# Altium footprint library 功率电感.PcbLib: 43 footprints (part 3 of 3)
Each footprint in its own frame and in the unit in brackets; x right, y up, seen from the top. Pads: shape width x height; smd on the part's side, far side on the other; paste and mask are expansions set on the pad; w line width, h text height; cw(c..) or ccw(c..) is an arc to the next point about the centre after c.
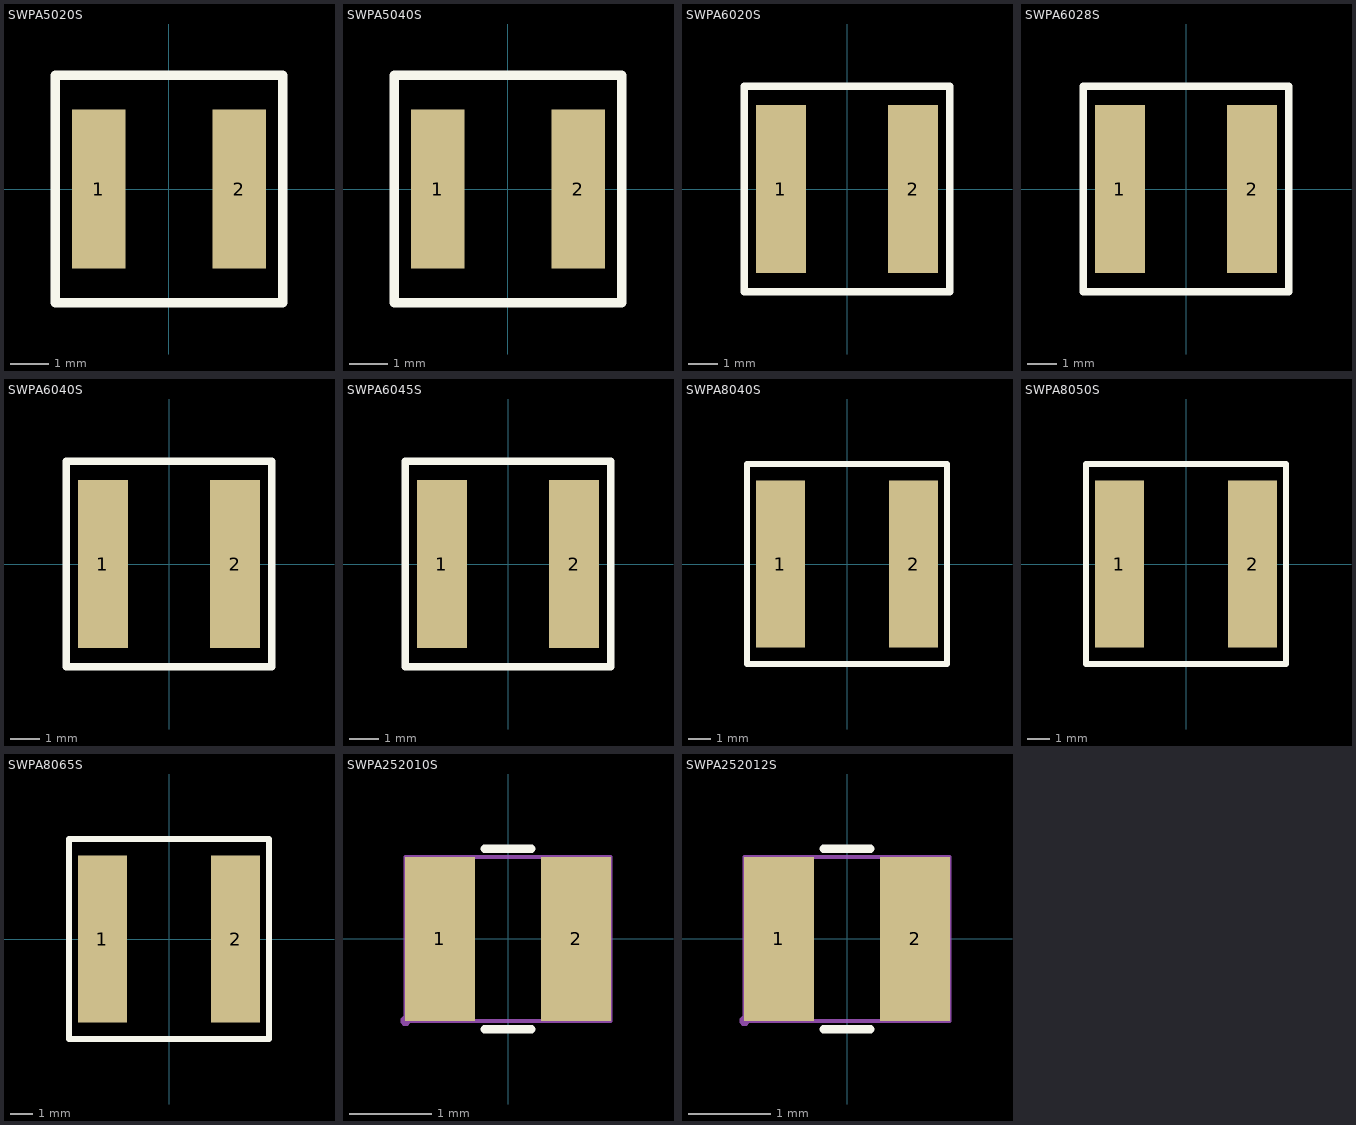
[diagram p2: the footprints below, top view; thin cyan lines are the x and y axes]

## SWPA5020S [mm] "轮廓5mm*5mm ，焊盘间距2.3mm（蒜米工坊）"
height 2
pads (2):
  rect 1.4x4.2 smd: 1(-1.85,0) 2(1.85,0)
Top Overlay:
  lines w0.254: -3,-3 -3,3 3,3 3,-3 -3,-3
3D body "5020S.STEP": height 2, standoff -0.02, extent -2.5,-2.5 2.5,2.5

## SWPA5040S [mm] "轮廓5mm*5mm ，焊盘间距2.3mm（蒜米工坊）"
height 4
pads (2):
  rect 1.4x4.2 smd: 1(-1.85,0) 2(1.85,0)
Top Overlay:
  lines w0.254: -3,-3 -3,3 3,3 3,-3 -3,-3
3D body "5040S.SLDPRT": height 4, standoff -0.02, extent -2.5,-2.5 2.5,2.5

## SWPA6020S [mm] "轮廓6mm*6mm ，焊盘间距2.8mm（蒜米工坊）"
height 2
pads (2):
  rect 1.7x5.7 smd: 1(-2.25,0) 2(2.25,0)
Top Overlay:
  lines w0.254: -3.5,-3.5 3.5,-3.5 3.5,3.5 0,3.5 -3.5,3.5 -3.5,-3.5
3D body "6020S.STEP": height 2, standoff -0.02, extent -3,-3 3,3

## SWPA6028S [mm] "轮廓6mm*6mm ，焊盘间距2.8mm（蒜米工坊）"
height 2.8
pads (2):
  rect 1.7x5.7 smd: 1(-2.25,0) 2(2.25,0)
Top Overlay:
  lines w0.254: -3.5,-3.5 -3.5,3.5 0,3.5 3.5,3.5 3.5,-3.5 -3.5,-3.5
3D body "6028S.STEP": height 2.5, standoff -0.02, extent -3,-3 3,3

## SWPA6040S [mm] "轮廓6mm*6mm ，焊盘间距2.8mm（蒜米工坊）"
height 4
pads (2):
  rect 1.7x5.7 smd: 1(-2.25,0) 2(2.25,0)
Top Overlay:
  lines w0.254: -3.5,-3.5 3.5,-3.5 3.5,3.5 0,3.5 -3.5,3.5 -3.5,-3.5
3D body "6040S.STEP": height 4, standoff -0.02, extent -3,-3 3,3

## SWPA6045S [mm] "轮廓6mm*6mm ，焊盘间距2.8mm（蒜米工坊）"
height 4.5
pads (2):
  rect 1.7x5.7 smd: 1(-2.25,0) 2(2.25,0)
Top Overlay:
  lines w0.254: -3.5,-3.5 3.5,-3.5 3.5,3.5 0,3.5 -3.5,3.5 -3.5,-3.5
3D body "6045S.STEP": height 4.5, standoff -0.02, extent -3,-3 3,3

## SWPA8040S [mm] "轮廓8mm*8mm ，焊盘间距3.8mm（蒜米工坊）"
height 4
pads (2):
  rect 2.2x7.5 smd: 1(-3,0) 2(3,0)
Top Overlay:
  lines w0.254: -4.5,-4.5 -4.5,4.5 0,4.5 4.5,4.5 4.5,-4.5 -4.5,-4.5
3D body "8040.STEP": height 4, standoff -0.02, extent -4,-4 4,4

## SWPA8050S [mm] "轮廓8mm*8mm ，焊盘间距3.8mm（蒜米工坊）"
height 5
pads (2):
  rect 2.2x7.5 smd: 1(-3,0) 2(3,0)
Top Overlay:
  lines w0.254: -4.5,-4.5 -4.5,4.5 0,4.5 4.5,4.5 4.5,-4.5 -4.5,-4.5
3D body "8050.STEP": height 5, standoff -0.02, extent -4,-4 4,4

## SWPA8065S [mm] "轮廓8mm*8mm ，焊盘间距3.8mm（蒜米工坊）"
height 6.5
pads (2):
  rect 2.2x7.5 smd: 1(-3,0) 2(3,0)
Top Overlay:
  lines w0.254: -4.5,-4.5 4.5,-4.5 4.5,4.5 0,4.5 -4.5,4.5 -4.5,-4.5
3D body "8065.STEP": height 6.5, standoff -0.02, extent -4,-4 4,4

## SWPA252010S [mm]
pads (2):
  rect 0.85x2 smd: 1(-0.83,0) 2(0.83,0)
Top Overlay:
  lines w0.102: -0.288,-1.1 0.287,-1.1 ; -0.288,1.1 0.287,1.1
Mechanical 15:
  region: 0.43,1 1.23,1 1.23,-1 0.43,-1
  region: -1.23,1 -0.43,1 -0.43,-1 -1.23,-1
  region: -1.19,-1 -1.19,-0.975 -1.225,-0.94 -1.275,-0.94 -1.31,-0.975 -1.31,-1 -1.31,-1.025 -1.275,-1.06 -1.225,-1.06 -1.19,-1.025
  lines w0.051: -1.25,-1 1.25,-1 1.25,1 -1.25,1 -1.25,-1
3D body "U1.step": height 1.21, standoff 0, extent -1.251,-1.001 1.251,1.001

## SWPA252012S [mm]
pads (2):
  rect 0.85x2 smd: 1(-0.83,0) 2(0.83,0)
Top Overlay:
  lines w0.102: -0.288,-1.1 0.287,-1.1 ; -0.288,1.1 0.287,1.1
Mechanical 15:
  region: -1.19,-1 -1.19,-0.975 -1.225,-0.94 -1.275,-0.94 -1.31,-0.975 -1.31,-1 -1.31,-1.025 -1.275,-1.06 -1.225,-1.06 -1.19,-1.025
  region: -1.23,1 -0.43,1 -0.43,-1 -1.23,-1
  region: 0.43,1 1.23,1 1.23,-1 0.43,-1
  lines w0.051: -1.25,-1 -1.25,1 1.25,1 1.25,-1 -1.25,-1
3D body "U1.step": height 1.21, standoff 0, extent -1.251,-1.001 1.251,1.001